# Altium footprint library TempdevAmmy.PcbLib: 42 footprints (part 1 of 3)
Each footprint in its own frame and in the unit in brackets; x right, y up, seen from the top. Pads: shape width x height; smd on the part's side, far side on the other; paste and mask are expansions set on the pad; w line width, h text height; cw(c..) or ccw(c..) is an arc to the next point about the centre after c.
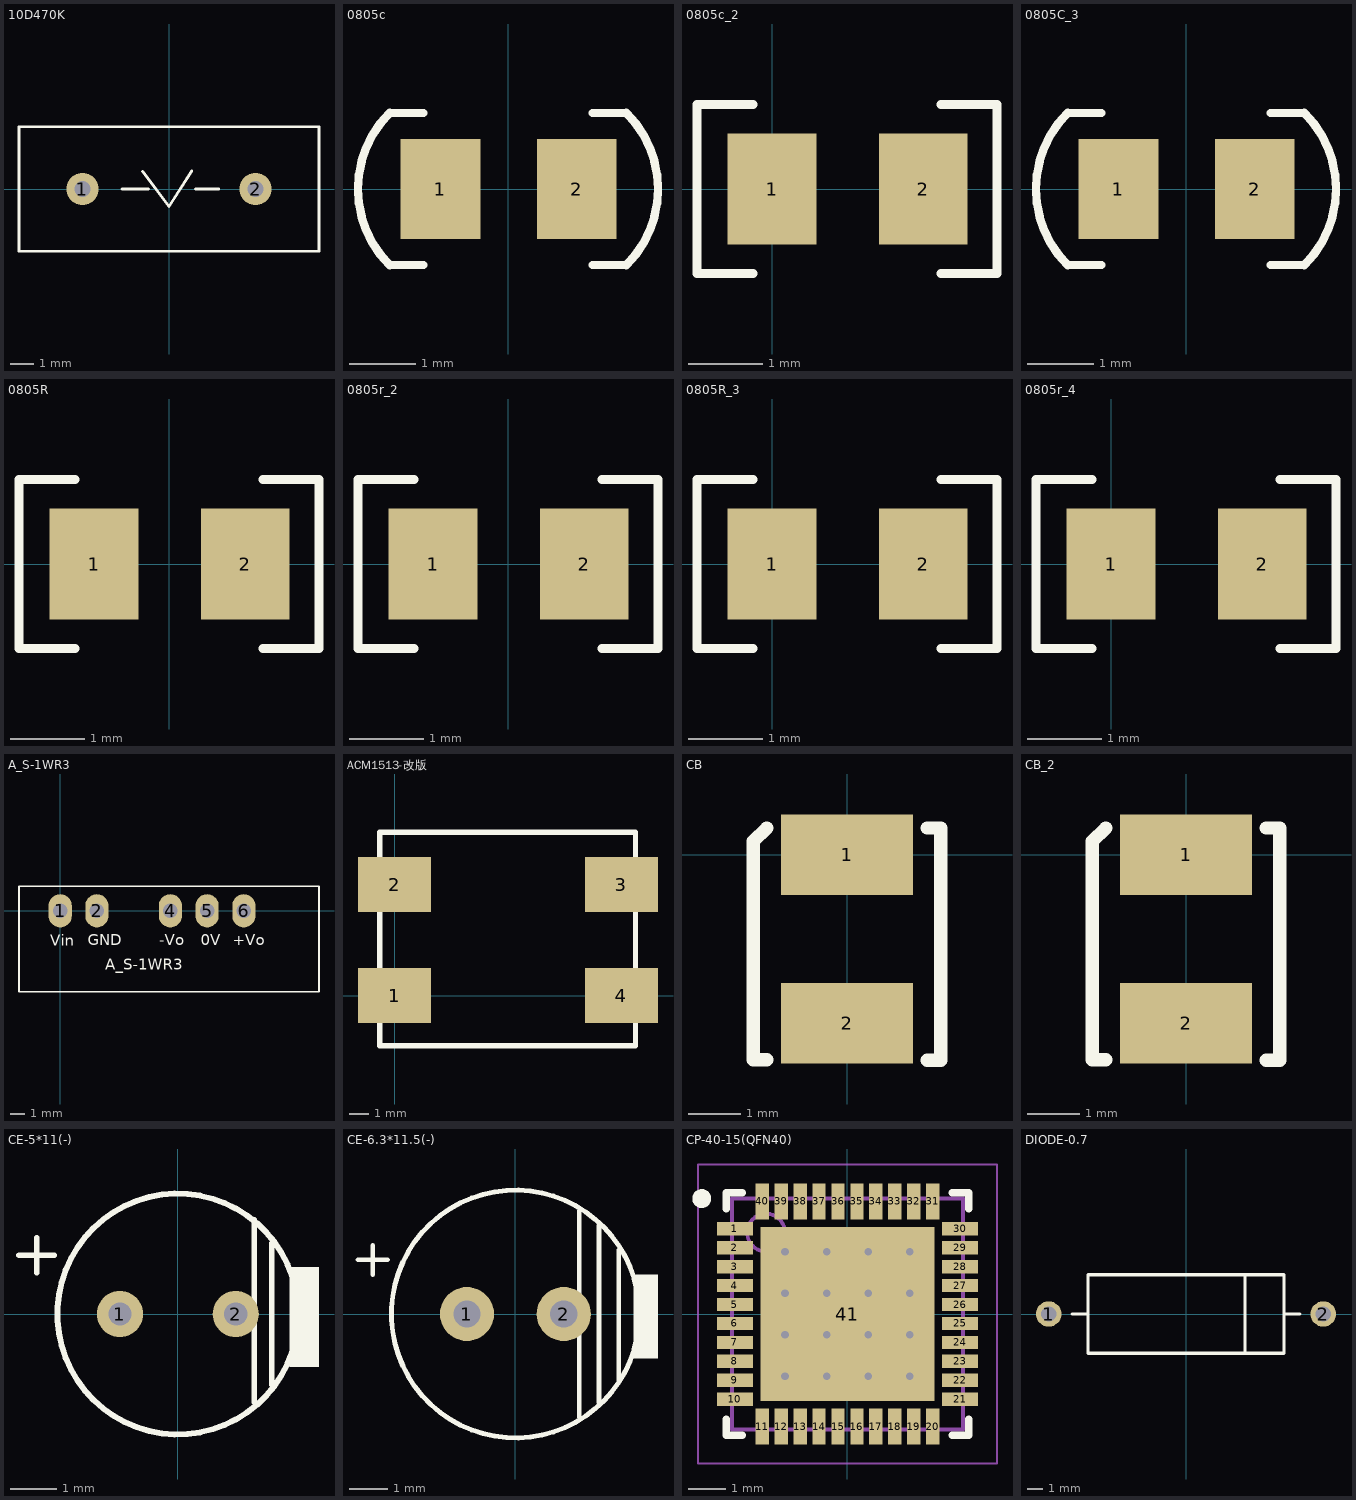
[diagram p0: the footprints below, top view; thin cyan lines are the x and y axes]

## 10D470K [mm]
pads (2):
  round 1.4 hole 0.7: 1(-3.75,0) 2(3.75,0)
Top Overlay:
  lines w0.12: -2.032,0 -0.889,0 ; -1.143,0.762 0,-0.762 0.983,0.783 ; 1.143,0 2.159,0 ; -6.5,-2.7 6.5,-2.7 6.5,2.7 -6.5,2.7 -6.5,-2.7

## 0805c [mm]
pads (2):
  rect 1.2x1.5 smd: 1(-1.016,0) 2(1.032,0)
Top Overlay:
  lines w0.12: -1.778,-1.143 -1.27,-1.143 ; -1.778,1.143 -1.27,1.143 ; 1.27,-1.143 1.778,-1.143 ; 1.27,1.143 1.778,1.143
  lines w0.127: -1.778,-1.143 cw(c-0.635,0) -1.778,1.143 ; 1.778,-1.143 ccw(c0.635,0) 1.778,1.143

## 0805c_2 [mm]
pads (2):
  rect 1.2x1.5 smd: 1(0,0) 2(2.048,0)
Top Overlay:
  lines w0.12: -0.254,-1.143 -1.016,-1.143 -1.016,1.143 -0.254,1.143 ; 2.286,-1.143 3.048,-1.143 3.048,1.143 2.286,1.143
3D body "CircuitWorks-CAPACITOR 0805.step": height 0.73, standoff -0.03, extent 0.016,-0.655 2.016,0.655

## 0805C_3 [mm]
pads (2):
  rect 1.2x1.5 smd: 1(-1.016,0) 2(1.032,0)
Top Overlay:
  lines w0.12: -1.778,-1.143 -1.27,-1.143 ; -1.778,1.143 -1.27,1.143 ; 1.27,-1.143 1.778,-1.143 ; 1.27,1.143 1.778,1.143
  lines w0.127: -1.778,-1.143 cw(c-0.635,0) -1.778,1.143 ; 1.778,-1.143 ccw(c0.635,0) 1.778,1.143

## 0805R [mm]
pads (2):
  rect 1.2x1.5 smd: 1(-1.016,0) 2(1.032,0)
Top Overlay:
  lines w0.12: -1.27,-1.143 -2.032,-1.143 -2.032,1.143 -1.27,1.143 ; 1.27,-1.143 2.032,-1.143 2.032,1.143 1.27,1.143

## 0805r_2 [mm]
pads (2):
  rect 1.2x1.5 smd: 1(-1.016,0) 2(1.032,0)
Top Overlay:
  lines w0.12: -1.27,-1.143 -2.032,-1.143 -2.032,1.143 -1.27,1.143 ; 1.27,-1.143 2.032,-1.143 2.032,1.143 1.27,1.143

## 0805R_3 [mm]
pads (2):
  rect 1.2x1.5 smd: 1(0,0) 2(2.048,0)
Top Overlay:
  lines w0.12: -0.254,-1.143 -1.016,-1.143 -1.016,1.143 -0.254,1.143 ; 2.286,-1.143 3.048,-1.143 3.048,1.143 2.286,1.143
3D body "User Library-RES_2013-0805.step": height 0.76, standoff 0, extent -0.134,-0.675 2.166,0.675

## 0805r_4 [mm]
pads (2):
  rect 1.2x1.5 smd: 1(0,0) 2(2.048,0)
Top Overlay:
  lines w0.12: -0.254,-1.143 -1.016,-1.143 -1.016,1.143 -0.254,1.143 ; 2.286,-1.143 3.048,-1.143 3.048,1.143 2.286,1.143
3D body "User Library-RES_2013-0805.step": height 0.76, standoff 0, extent -0.134,-0.675 2.166,0.675

## A_S-1WR3 [mm]
pads (5):
  oval 1.6x2.3 hole 1: 1(0,0) 2(2.54,0) 4(7.62,0) 5(10.16,0) 6(12.7,0)
Top Overlay:
  lines w0.127: -2.85,-5.6 17.9,-5.6 17.9,1.7 -2.85,1.7 -2.85,-5.6
  text "A_S-1WR3" at 3.126,-4.069 h0.76
  text "+Vo" at 11.946,-2.377 h0.76
  text "GND" at 1.897,-2.377 h0.76
  text "Vin" at -0.704,-2.413 h0.76
  text "-Vo" at 6.866,-2.377 h0.76
  text "0V" at 9.73,-2.377 h0.76

## ACM1513-改版 [mm] "原封装引脚错了-改版将引脚更改"
pads (4):
  rect 3.7x2.8 smd: 1(0,0) 2(0,5.611) 3(11.468,5.611) 4(11.468,0)
Top Overlay:
  lines w0.254: -0.75,-2.54 -0.75,8.255 12.192,8.255 12.192,-2.54 -0.75,-2.54

## CB [mm]
pads (2):
  rect 2.5x1.524 smd: 1(0,0) 2(0,-3.2)
Top Overlay:
  lines w0.254: -1.524,-3.891 -1.778,-3.891 -1.778,0.254 -1.524,0.508 ; 1.524,-3.905 1.778,-3.905 1.778,0.508 1.524,0.508

## CB_2 [mm]
pads (2):
  rect 2.5x1.524 smd: 1(0,0) 2(0,-3.2)
Top Overlay:
  lines w0.254: -1.524,-3.891 -1.778,-3.891 -1.778,0.254 -1.524,0.508 ; 1.524,-3.905 1.778,-3.905 1.778,0.508 1.524,0.508
3D body "t494b226k010at.stp": height 1.57, standoff -0.53, extent -1.476,-3.501 1.524,0.199

## CE-5*11(-) [mm]
pads (2):
  round 1 hole 0.5: 1(-1.25,0) 2(1.25,0)
Top Overlay:
  circle w0.127: c0,0 r2.6
  rectangle: 2.413,-1.143 3.048,1.016
  lines w0.12: -3.429,1.27 -2.667,1.27 ; -3.048,0.889 -3.048,1.651 ; 1.651,-1.905 1.651,2.032 ; 2.032,-1.524 2.032,1.524

## CE-6.3*11.5(-) [mm]
pads (2):
  round 1.4 hole 0.7: 1(-1.25,0) 2(1.25,0)
Top Overlay:
  circle w0.127: c0,0 r3.2
  rectangle: 3.048,-1.143 3.683,1.016
  lines w0.12: -4.064,1.397 -3.302,1.397 ; -3.683,1.016 -3.683,1.778 ; 1.651,-2.667 1.651,2.667 ; 2.159,-2.286 2.159,2.286 ; 2.667,-1.778 2.667,1.651

## CP-40-15(QFN40) [mm] "QFN, 40-Leads, Body 6.00x6.00mm, Pitch 0.50mm, Thermal Pad 4.60x4.60mm, IPC Low Density"
height 1
pads (41):
  rect 0.95x0.35 smd: 1(-2.975,2.25) 2(-2.975,1.75) 3(-2.975,1.25) 4(-2.975,0.75) 5(-2.975,0.25) 6(-2.975,-0.25) 7(-2.975,-0.75) 8(-2.975,-1.25) 9(-2.975,-1.75) 10(-2.975,-2.25) 21(2.975,-2.25) 22(2.975,-1.75) 23(2.975,-1.25) 24(2.975,-0.75) 25(2.975,-0.25) 26(2.975,0.25) 27(2.975,0.75) 28(2.975,1.25) 29(2.975,1.75) 30(2.975,2.25)
  rect 0.35x0.95 smd: 11(-2.25,-2.975) 12(-1.75,-2.975) 13(-1.25,-2.975) 14(-0.75,-2.975) 15(-0.25,-2.975) 16(0.25,-2.975) 17(0.75,-2.975) 18(1.25,-2.975) 19(1.75,-2.975) 20(2.25,-2.975) 31(2.25,2.975) 32(1.75,2.975) 33(1.25,2.975) 34(0.75,2.975) 35(0.25,2.975) 36(-0.25,2.975) 37(-0.75,2.975) 38(-1.25,2.975) 39(-1.75,2.975) 40(-2.25,2.975)
  rect 4.6x4.6 smd: 41(0,0)
via 1.65,-1.65 diameter 0.5 hole 0.2
via 0.55,-1.65 diameter 0.5 hole 0.2
via -0.55,-1.65 diameter 0.5 hole 0.2
via -1.65,-1.65 diameter 0.5 hole 0.2
via 1.65,-0.55 diameter 0.5 hole 0.2
via 0.55,-0.55 diameter 0.5 hole 0.2
via -0.55,-0.55 diameter 0.5 hole 0.2
via -1.65,-0.55 diameter 0.5 hole 0.2
via 1.65,0.55 diameter 0.5 hole 0.2
via 0.55,0.55 diameter 0.5 hole 0.2
via -0.55,0.55 diameter 0.5 hole 0.2
via -1.65,0.55 diameter 0.5 hole 0.2
via 1.65,1.65 diameter 0.5 hole 0.2
via 0.55,1.65 diameter 0.5 hole 0.2
via -0.55,1.65 diameter 0.5 hole 0.2
via -1.65,1.65 diameter 0.5 hole 0.2
Top Overlay:
  circle w0.25: c-3.85,3.05 r0.125
  lines w0.2: -3.2,-2.775 -3.2,-3.2 -2.775,-3.2 ; -3.2,2.775 -3.2,3.2 -2.775,3.2 ; 2.775,-3.2 3.2,-3.2 3.2,-2.775 ; 2.775,3.2 3.2,3.2 3.2,2.775
Mechanical 13:
  circle w0.1: c-2.15,2.15 r0.5
  lines w0.1: -3.05,-3.05 3.05,-3.05 3.05,3.05 -3.05,3.05 -3.05,-3.05
Mechanical 15:
  lines w0.05: -3.95,-3.95 3.95,-3.95 3.95,3.95 -3.95,3.95 -3.95,-3.95
  lines w0.1: -0.5,0 0.5,0 ; 0,-0.5 0,0.5
3D body "CP-40-15(QFN40).step": height 1, standoff 0, extent -3.1,-3.1 3.1,3.1

## DIODE-0.7 [mm] "Diode, Thru-Hole; 2 Leads; 0.7 in Pin Spacing"
height 5.08
pads (2):
  round 1.65 hole 1: 1(-8.89,0) 2(8.89,0)
Top Overlay:
  lines w0.2: -7.366,0 -6.35,0 ; 3.81,-2.54 3.81,2.54 ; 6.35,0 7.366,0 ; -6.35,-2.54 -6.35,2.54 6.35,2.54 6.35,-2.54 -6.35,-2.54